# Altium footprint library SparkFun.PCBLIB: 674 footprints (part 28 of 44)
Each footprint in its own frame and in the unit in brackets; x right, y up, seen from the top. Pads: shape width x height; smd on the part's side, far side on the other; paste and mask are expansions set on the pad; w line width, h text height; cw(c..) or ccw(c..) is an arc to the next point about the centre after c.
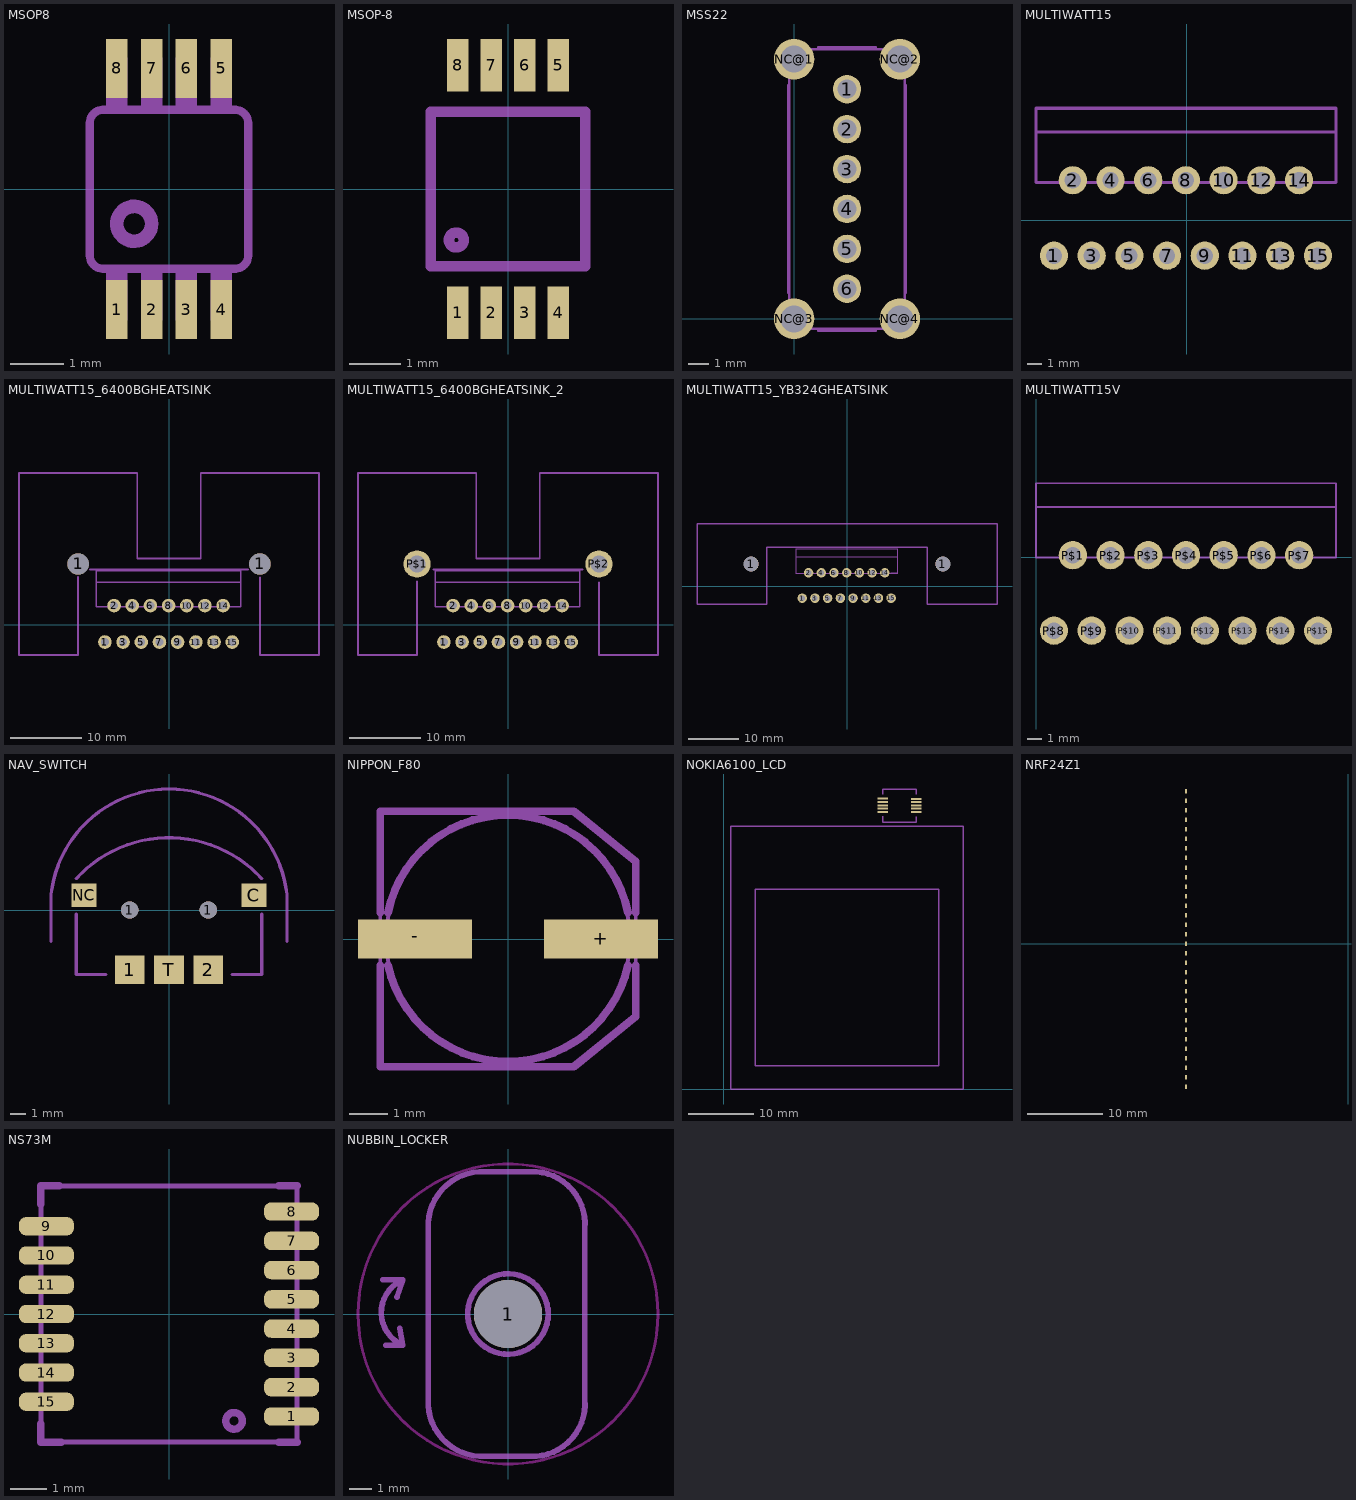
[diagram p27: the footprints below, top view; thin cyan lines are the x and y axes]

## MSOP8 [mil]
pads (8):
  rect 15.75x43.31 smd: 1(-38.39,-88.58) 2(-12.8,-88.58) 3(12.8,-88.58) 4(38.39,-88.58) 5(38.39,88.58) 6(12.8,88.58) 7(-12.8,88.58) 8(-38.39,88.58)
Mechanical 2:
  circle w10: c-25.59,-25.59 r12.8
  lines w6: -58.27,-48.82 ccw(c-48.43,-48.82) -48.43,-58.66 ; -58.27,-48.43 -58.27,48.43 cw(c-48.43,48.43) -48.43,58.27 ; -48.03,-58.66 48.82,-58.66 ; -48.03,58.27 48.82,58.27 ; 48.43,-58.66 ccw(c48.43,-48.82) 58.27,-48.82 58.27,48.43 ccw(c48.43,48.43) 48.43,58.27
Mechanical 18:
  rectangle: -46.26,-96.46 -30.51,-61.02
  rectangle: -20.67,-96.46 -4.92,-61.02
  rectangle: 4.92,-96.46 20.67,-61.02
  rectangle: 30.51,-96.46 46.26,-61.02
  rectangle: 30.51,61.02 46.26,96.46
  rectangle: 4.92,61.02 20.67,96.46
  rectangle: -20.67,61.02 -4.92,96.46
  rectangle: -46.26,61.02 -30.51,96.46

## MSOP-8 [mil]
pads (8):
  rect 16.14x40.16 smd: 1(-38.39,-94.49) 2(-12.8,-94.49) 3(12.8,-94.49) 4(38.39,-94.49) 5(38.39,94.49) 6(12.8,94.49) 7(-12.8,94.49) 8(-38.39,94.49)
Mechanical 2:
  circle w8: c-39.5,-39 r5.65
  lines w8: -59.06,-59.06 -59.06,59.06 ; 59.06,-59.06 59.06,59.06
Mechanical 18:
  lines w8: -59.06,-59.06 59.06,-59.06 ; -59.06,59.06 59.06,59.06

## MSS12 [mil]

## MSS22 [mm]
pads (10):
  round 1.425 hole 0.95: 1(2.65,11.5) 2(2.65,9.5) 3(2.65,7.5) 4(2.65,5.5) 5(2.65,3.5) 6(2.65,1.5)
  round 2.025 hole 1.35: NC@1(0,13) NC@2(5.3,13) NC@3(0,0) NC@4(5.3,0)
Mechanical 2:
  lines w0.127: -0.3,1.3 -0.3,11.7 ; 1.2,-0.6 4.1,-0.6 ; 1.2,13.6 4.1,13.6 ; 5.6,1.3 5.6,11.7
Mechanical 18:
  lines w0.127: -0.25,-0.5 5.55,-0.5 5.55,13.5 -0.25,13.5 -0.25,-0.5

## MULTIWATT15 [mil]
pads (15):
  round 74.8 hole 43.31: 1(-352.36,-94.09) 2(-302.36,105.91) 3(-252.36,-94.09) 4(-202.36,105.91) 5(-152.36,-94.09) 6(-102.36,105.91) 7(-52.36,-94.09) 8(-2.36,105.91) 9(47.64,-94.09) 10(97.64,105.91) 11(147.64,-94.09) 12(197.64,105.91) 13(247.64,-94.09) 14(297.64,105.91) 15(347.64,-94.09)
Mechanical 2:
  lines w8: -400,100 -400,233.86 ; -399.61,100.39 -348.43,100.39 ; -255.91,100.39 -248.03,100.39 ; -155.51,100.39 -147.64,100.39 ; -57.09,100.39 -49.21,100.39 ; 43.31,100.39 51.18,100.39 ; 143.7,100.39 151.57,100.39 ; 244.09,100.39 251.97,100.39 ; 344.49,100.39 395.67,100.39 ; 395.28,100 395.28,233.86 ; -400,233.86 -400,296.85 395.28,296.85 395.28,233.86 ; -400,233.86 395.28,233.86
Mechanical 18:
  lines w8: -400,100 395.28,100

## MULTIWATT15_6400BGHEATSINK [mil]
pads (17):
  round 118 hole 118: 1(-500,335) 1(500,335)
  round 74.8 hole 43.31: 1(-352.36,-94.09) 2(-302.36,105.91) 3(-252.36,-94.09) 4(-202.36,105.91) 5(-152.36,-94.09) 6(-102.36,105.91) 7(-52.36,-94.09) 8(-2.36,105.91) 9(47.64,-94.09) 10(97.64,105.91) 11(147.64,-94.09) 12(197.64,105.91) 13(247.64,-94.09) 14(297.64,105.91) 15(347.64,-94.09)
Mechanical 2:
  lines w8: -400,100 -400,233.86 ; -399.61,100.39 -348.43,100.39 ; -255.91,100.39 -248.03,100.39 ; -155.51,100.39 -147.64,100.39 ; -57.09,100.39 -49.21,100.39 ; 43.31,100.39 51.18,100.39 ; 143.7,100.39 151.57,100.39 ; 244.09,100.39 251.97,100.39 ; 344.49,100.39 395.67,100.39 ; 395.28,100 395.28,233.86 ; -400,233.86 -400,296.85 395.28,296.85 395.28,233.86 ; -400,233.86 395.28,233.86
Mechanical 18:
  lines w8: -400,100 395.28,100
  lines w10: -500,265 -500,-165 -825,-165 -825,835 -175,835 -175,366 175,366 175,835 825,835 825,-165 500,-165 500,260 ; -435,304 435,304

## MULTIWATT15_6400BGHEATSINK_2 [mil]
pads (17):
  round 74.8 hole 43.31: 1(-352.36,-94.09) 2(-302.36,105.91) 3(-252.36,-94.09) 4(-202.36,105.91) 5(-152.36,-94.09) 6(-102.36,105.91) 7(-52.36,-94.09) 8(-2.36,105.91) 9(47.64,-94.09) 10(97.64,105.91) 11(147.64,-94.09) 12(197.64,105.91) 13(247.64,-94.09) 14(297.64,105.91) 15(347.64,-94.09)
  round 150 hole 95: P$1(-500,335) P$2(500,335)
Mechanical 2:
  lines w8: -399.61,100.39 -348.43,100.39 ; -255.91,100.39 -248.03,100.39 ; -155.51,100.39 -147.64,100.39 ; -57.09,100.39 -49.21,100.39 ; 43.31,100.39 51.18,100.39 ; 143.7,100.39 151.57,100.39 ; 244.09,100.39 251.97,100.39 ; 344.49,100.39 395.67,100.39 ; -400,233.86 -400,100 395.28,100 395.28,233.86 ; -400,233.86 -400,296.85 395.28,296.85 395.28,233.86 ; -400,233.86 395.28,233.86
  lines w10: -500,240 -500,-165 -825,-165 -825,835 -175,835 -175,366 175,366 175,835 825,835 825,-165 500,-165 500,235 ; -410,304 410,304

## MULTIWATT15_YB324GHEATSINK [mil]
pads (17):
  round 118 hole 118: 1(-754,175) 1(754,175)
  round 74.8 hole 43.31: 1(-352.36,-94.09) 2(-302.36,105.91) 3(-252.36,-94.09) 4(-202.36,105.91) 5(-152.36,-94.09) 6(-102.36,105.91) 7(-52.36,-94.09) 8(-2.36,105.91) 9(47.64,-94.09) 10(97.64,105.91) 11(147.64,-94.09) 12(197.64,105.91) 13(247.64,-94.09) 14(297.64,105.91) 15(347.64,-94.09)
Mechanical 2:
  lines w8: -400,100 -400,233.86 ; -399.61,100.39 -348.43,100.39 ; -255.91,100.39 -248.03,100.39 ; -155.51,100.39 -147.64,100.39 ; -57.09,100.39 -49.21,100.39 ; 43.31,100.39 51.18,100.39 ; 143.7,100.39 151.57,100.39 ; 244.09,100.39 251.97,100.39 ; 344.49,100.39 395.67,100.39 ; 395.28,100 395.28,233.86 ; -400,233.86 -400,296.85 395.28,296.85 395.28,233.86 ; -400,233.86 395.28,233.86
Mechanical 18:
  lines w8: -400,100 395.28,100
  lines w10: -1181,-140 -630,-140 -630,305 630,305 630,-140 1181,-140 1181,490 -1181,490 -1181,-140

## MULTIWATT15V [mil]
pads (15):
  round 74.8 hole 43.31: P$1(97.64,5.91) P$2(197.64,5.91) P$3(297.64,5.91) P$4(397.64,5.91) P$5(497.64,5.91) P$6(597.64,5.91) P$7(697.64,5.91) P$8(47.64,-194.09) P$9(147.64,-194.09) P$10(247.64,-194.09) P$11(347.64,-194.09) P$12(447.64,-194.09) P$13(547.64,-194.09) P$14(647.64,-194.09) P$15(747.64,-194.09)
Mechanical 2:
  lines w5: 0,133.86 0,0 795.28,0 795.28,133.86 ; 0,133.86 0,196.85 795.28,196.85 795.28,133.86 ; 0,133.86 795.28,133.86

## NAV_SWITCH [mil]
pads (7):
  rect 74.8x70.87 smd: 1(-98.43,-149.61) 2(98.43,-149.61) T(0,-149.61)
  round 43.31 hole 43.31: 1(-98.43,0) 1(98.43,0)
  rect 62.99x59.06 smd: C(212.6,37.4) NC(-212.6,37.4)
Mechanical 2:
  lines w8: -232.28,-9.84 -232.28,-161.42 -157.48,-161.42 ; -232.28,78.74 cw(c0,-133.63) 232.28,78.74 ; 157.48,-161.42 232.28,-161.42 232.28,-9.84
Mechanical 18:
  lines w8: -295.28,-78.74 -295.28,39.37 cw(c0,5.99) 295.28,39.37 295.28,-78.74

## NEW [mil]

## NIPPON_F80 [mm]
pads (2):
  rect 2.95x1 smd: +(2.4,0) -(-2.4,0)
Mechanical 2:
  lines w0.203: -3.3,-0.685 -3.3,-3.3 1.7,-3.3 3.3,-2 3.3,-0.685 ; -3.3,0.685 -3.3,3.3 1.7,3.3 3.3,2 3.3,0.685 ; -3.1,-0.685 ccw(c0,0.009) 3.1,-0.685 ; -3.1,0.685 cw(c0,0.04) 3.1,0.685
Mechanical 18:
  circle w0.102: c0,0 r3.15
  lines w0.102: -3.3,-3.3 1.7,-3.3 3.3,-2 3.3,2 1.7,3.3 -3.3,3.3 -3.3,-3.3

## NOKIA6100_LCD [mil]
pads (10):
  rect 62.99x11.81 smd: 1(954.94,1744.53) 2(954.94,1724.84) 3(954.94,1705.16) 4(954.94,1685.47) 5(954.94,1665.79) 6(1157.06,1665.47) 7(1157.06,1685.16) 8(1157.06,1704.84) 9(1157.06,1724.53) 10(1157.06,1744.21)
Mechanical 2:
  lines w5: 1140,1200 1150,1200
  lines w8: 954.72,1603.15 954.72,1638.19 ; 955,1603 1155,1603 ; 955,1803 1155,1803 ; 955.12,1771.65 955.12,1802.76 ; 1155.12,1771.65 1155.12,1802.36 ; 1155.51,1603.15 1155.51,1637.4 ; 40,0 40,1580 1440,1580 1440,0 40,0 ; 190,140 190,1200 1150,1200 1290,1200 1290,140 190,140

## NRF24Z1 [mil]
pads (32):
  rect 9.06x23.62 smd: P$1(-850,800) P$2(-850,750) P$3(-850,700) P$4(-850,650) P$5(-850,600) P$6(-850,550) P$7(-850,500) P$8(-850,450) P$9(-850,400) P$10(-850,350) P$11(-850,300) P$12(-850,250) P$13(-850,200) P$14(-850,150) P$15(-850,100) P$16(-850,50) P$17(-850,0) P$18(-850,-50) P$19(-850,-100) P$20(-850,-150) P$21(-850,-200) P$22(-850,-250) P$23(-850,-300) P$24(-850,-350) P$25(-850,-400) P$26(-850,-450) P$27(-850,-500) P$28(-850,-550) P$29(-850,-600) P$30(-850,-650) P$31(-850,-700) P$32(-850,-750)

## NS73M [mm]
pads (15):
  rrect75% 1.5x0.5 smd: 1(3.35,-2.8) 2(3.35,-2) 3(3.35,-1.2) 4(3.35,-0.4) 5(3.35,0.4) 6(3.35,1.2) 7(3.35,2) 8(3.35,2.8) 9(-3.35,2.4) 10(-3.35,1.6) 11(-3.35,0.8) 12(-3.35,0) 13(-3.35,-0.8) 14(-3.35,-1.6) 15(-3.35,-2.4)
Mechanical 2:
  circle w0.203: c1.778,-2.921 r0.227
  lines w0.203: -3.5,-3 -3.5,-3.5 -2.95,-3.5 ; -3.5,3 -3.5,3.5 -3,3.5 ; 3,-3.5 3.5,-3.5 ; 3,3.5 3.5,3.5
Mechanical 18:
  lines w0.127: -3.5,-3.5 3.5,-3.5 3.5,3.5 -3.5,3.5 -3.5,-3.5

## NUBBIN_LOCKER [mil]
pads (1):
  round 120 hole 120: 1(0,0)
Keep-Out Layer:
  circle w5: c0,0 r263.48
Mechanical 2:
  lines w10: -220,60 -185,60 -195,30 ; -215,-55 -185,-55 -190,-25 ; -189.48,57.67 ccw(c-159.98,2.55) -186.43,-54.09
Mechanical 16:
  circle w10: c0,0 r70.71
  lines w10: -140,-150 -140,150 cw(c-45,155) -50,250 50,250 cw(c42.5,157.5) 135,150 135,-150 cw(c42.5,-157.5) 50,-250 -50,-250 cw(c-45,-155) -140,-150